# Altium footprint library 04.连接器件.pcb.PCBLIB: 363 footprints (part 1 of 23)
Each footprint in its own frame and in the unit in brackets; x right, y up, seen from the top. Pads: shape width x height; smd on the part's side, far side on the other; paste and mask are expansions set on the pad; w line width, h text height; cw(c..) or ccw(c..) is an arc to the next point about the centre after c.
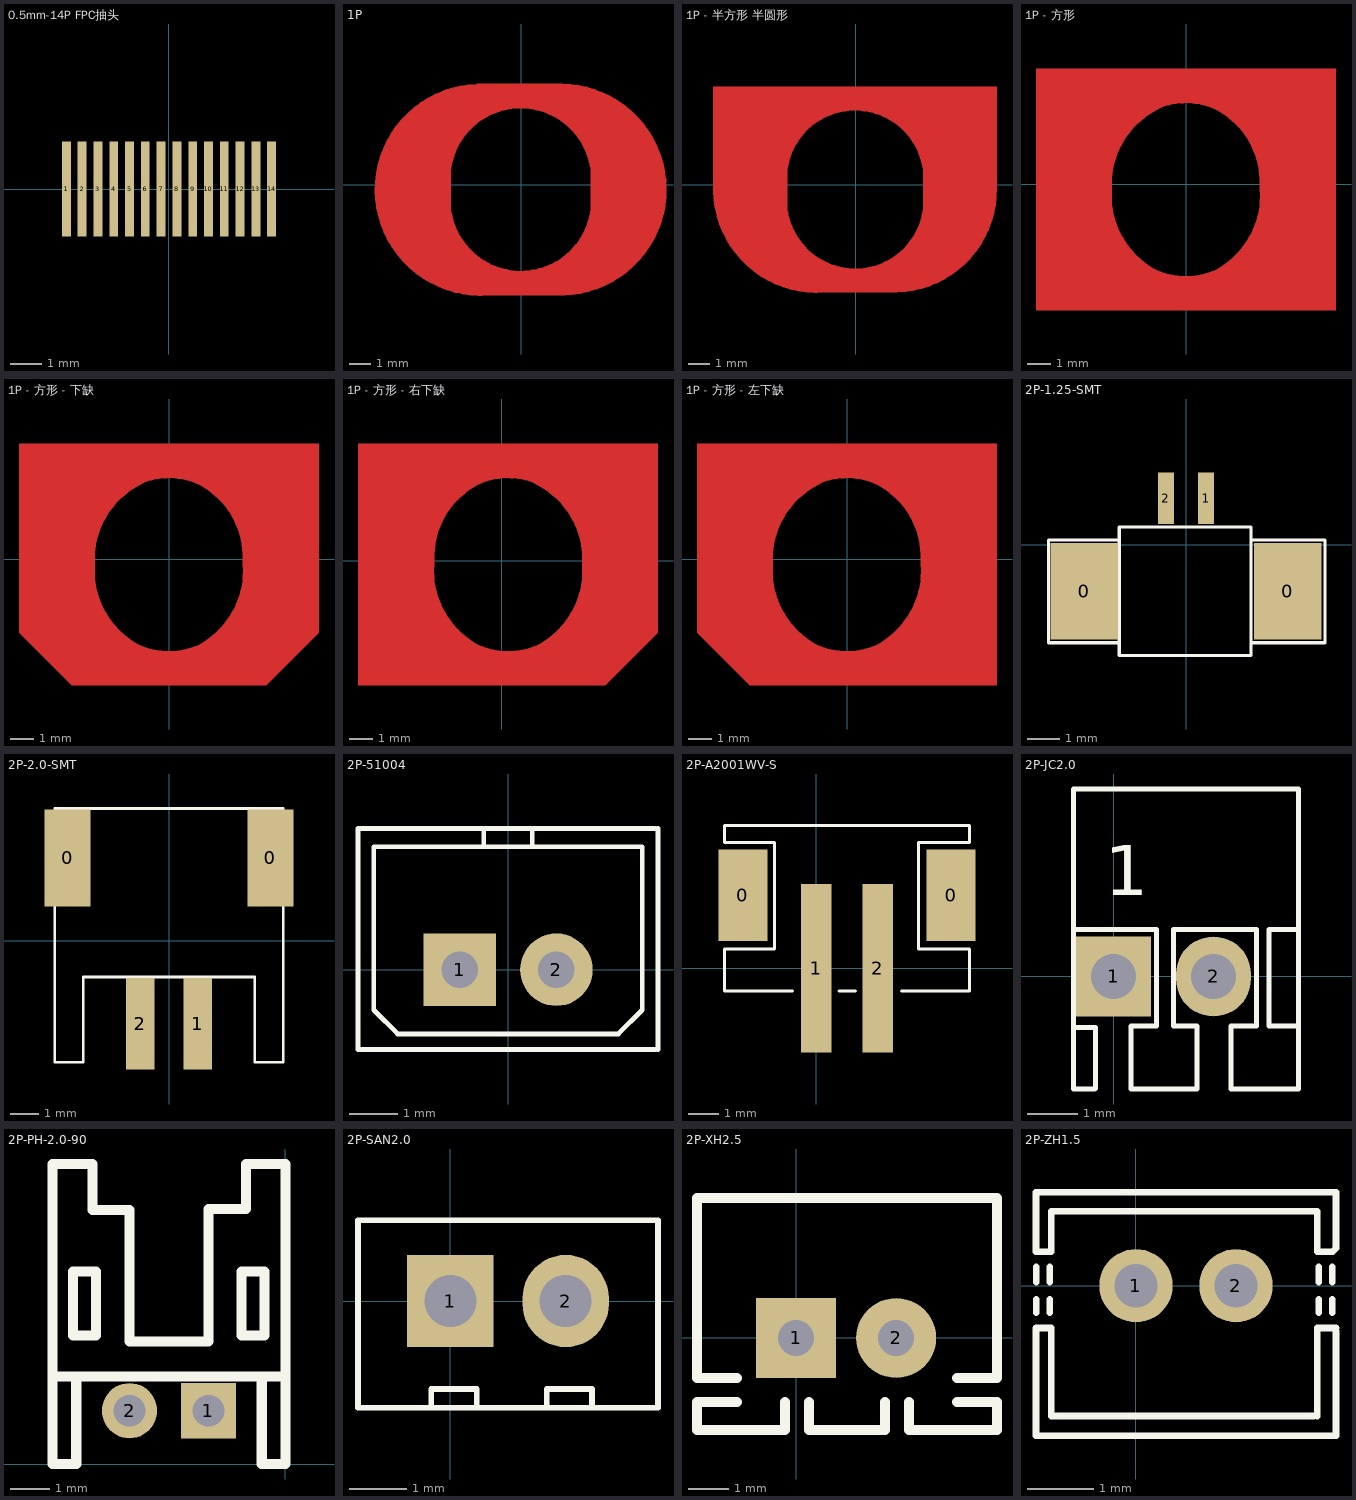
[diagram p0: the footprints below, top view; thin cyan lines are the x and y axes]

## 0.5mm-14P FPC抽头 [mm] "辅助锁触摸"
pads (14):
  rect 0.28x3 smd: 1(-3.25,0) 2(-2.75,0) 3(-2.25,0) 4(-1.75,0) 5(-1.25,0) 6(-0.75,0) 7(-0.25,0) 8(0.25,0) 9(0.75,0) 10(1.25,0) 11(1.75,0) 12(2.25,0) 13(2.75,0) 14(3.25,0)

## 1P [mm] "触摸按键"
TopLayer:
  circle w0.4: c-0.018,-0.234 r4.195
  rectangle: -2.176,-4.77 1.99,-4.604
  rectangle: -2.126,4.021 2.135,4.317
  region: 1.984,-4.734 1.984,-4.239 -2.061,-4.239 -2.061,-4.734
  region: -1.805,-4.377 -1.805,-3.837 -3.385,-3.837 -3.385,-4.377
  region: -4.353,-2.239 -4.353,1.917 -5.851,1.917 -5.851,-2.239
  region: -3.746,-2.878 -3.746,-2.157 -5.641,-2.157 -5.641,-2.878
  region: -2.993,-3.522 -2.993,-2.96 -4.851,-2.96 -4.851,-3.522
  region: -3.417,-3.253 -3.417,-2.687 -5.112,-2.687 -5.112,-3.253
  region: -3.581,-2.769 -3.581,-2.49 -3.901,-2.49 -3.901,-2.769
  region: -3.951,-2.244 -3.951,-1.814 -4.527,-1.814 -4.527,-2.244
  region: -4.084,-1.942 -4.084,-0.846 -4.513,-0.846 -4.513,-1.942
  region: -5.038,-3.039 -5.038,-2.783 -5.235,-2.783 -5.235,-3.039
  region: -2.568,-3.933 -2.568,-3.44 -4.084,-3.44 -4.084,-3.933
  region: -3.992,-3.81 -3.992,-3.417 -4.486,-3.417 -4.486,-3.81
  region: -3.271,-4.143 -3.271,-3.723 -3.869,-3.723 -3.869,-4.143
  region: -2.463,-3.906 -2.463,-3.728 -2.663,-3.728 -2.663,-3.906
  region: -4.034,0.565 -4.034,3.218 -4.509,3.218 -4.509,0.565
  region: -4.171,0.218 -4.171,0.903 -4.586,0.903 -4.586,0.218
  region: -4.435,1.848 -4.435,2.634 -5.244,2.634 -5.244,1.848
  region: -5.171,1.812 -5.171,2.346 -5.568,2.346 -5.568,1.812
  region: -4.362,2.542 -4.362,3.081 -5.006,3.081 -5.006,2.542
  region: -3.527,1.798 -3.527,3.721 -4.088,3.721 -4.088,1.798
  region: -3.846,1.437 -3.846,1.94 -4.166,1.94 -4.166,1.437
  region: -3.91,3.081 -3.91,3.428 -4.362,3.428 -4.362,3.081
  region: -5.76,-1.81 -5.76,1.328 -6.162,1.328 -6.162,-1.81
  region: 6.123,-0.906 6.123,1.241 4.205,1.241 4.205,-0.906
  region: 5.885,1.122 5.885,1.962 3.757,1.962 3.757,1.122
  region: 4.411,0.889 4.411,1.346 4.055,1.346 4.055,0.889
  region: 6.114,-1.855 6.114,-0.86 4.054,-0.86 4.054,-1.855
  region: 5.84,-2.49 5.84,-1.792 3.694,-1.792 3.694,-2.49
  region: 5.442,-2.856 5.442,-2.431 3.456,-2.431 3.456,-2.856
  region: 5.196,-3.221 5.196,-2.815 3.182,-2.815 3.182,-3.221
  region: 4.844,-3.627 4.844,-3.175 2.789,-3.175 2.789,-3.627
  region: 4.347,-3.824 4.347,-3.623 2.456,-3.623 2.456,-3.824
  region: 4.004,-3.956 4.004,-3.65 2.383,-3.65 2.383,-3.956
  region: 3.255,-4.135 3.255,-3.819 2.063,-3.819 2.063,-4.135
  region: 2.949,-3.65 2.949,-3.559 2.661,-3.559 2.661,-3.65
  region: 2.123,-4.239 2.123,-4.075 1.606,-4.075 1.606,-4.239
  region: 2.397,-4.472 2.397,-3.993 1.785,-3.993 1.785,-4.472
  region: 5.539,1.862 5.539,2.282 3.68,2.282 3.68,1.862
  region: 5.297,2.177 5.297,2.693 3.392,2.693 3.392,2.177
  region: 3.748,2.008 3.748,2.264 3.534,2.264 3.534,2.008
  region: 4.972,2.597 4.972,3.045 2.903,3.045 2.903,2.597
  region: 3.547,2.438 3.547,2.757 3.182,2.757 3.182,2.438
  region: 4.479,2.953 4.479,3.342 2.598,3.342 2.598,2.953
  region: 4.182,3.237 4.182,3.702 2.008,3.702 2.008,3.237
  region: 3.283,3.574 3.283,3.885 1.57,3.885 1.57,3.574
  region: 2.022,3.867 2.022,4.264 -2.042,4.264 -2.042,3.867
  region: -2.983,2.474 -2.983,3.924 -3.582,3.924 -3.582,2.474
  region: -3.431,2.33 -3.431,2.602 -3.632,2.602 -3.632,2.33
  region: -1.59,3.739 -1.59,4.091 -2.645,4.091 -2.645,3.739
  region: -1.873,3.62 -1.873,3.931 -3.097,3.931 -3.097,3.62
  region: -2.357,3.076 -2.357,3.812 -3.079,3.812 -3.079,3.076
  region: -2.042,3.392 -2.042,3.867 -2.458,3.867 -2.458,3.392
  region: -2.86,2.917 -2.86,3.195 -3.134,3.195 -3.134,2.917
  region: -2.54,3.757 -2.54,4.081 -3.186,4.081 -3.186,3.757
  lines w0.4: 1.851,-4.532 ccw(c1.93,-3.996) 2.465,-4.075 ; 1.865,-4.486 ccw(c2.102,-3.687) 2.901,-3.924 ; 2.159,-4.438 ccw(c2.491,-3.288) 3.641,-3.621
  lines w0.5: -3.124,2.795 ccw(c0.928,0.061) -1.024,-4.42 ; -2.598,2.95 cw(c0.025,0.527) -1.554,3.73 ; -2.072,-4.52 cw(c-2.033,-0.23) -1.992,4.06 ; -1.271,3.929 ccw(c0.722,-0.156) -1.073,-4.333 ; 0.549,3.954 cw(c-0.023,0.556) 2.921,2.346 ; 1.357,4.002 cw(c-1.014,-0.135) 1.616,-4.112 ; 1.504,-4.481 ccw(c2.017,-0.222) 2.056,4.068 ; 2.921,2.363 cw(c-0.852,-0.254) 3.701,-0.848
  lines w0.8: -3.647,0.584 cw(c-0.022,0.275) 3.555,0.943 ; -3.628,1.459 -3.628,-1.477 -3.598,-1.507 ; -3.594,-1.407 ccw(c-0.017,-0.739) 3.591,-1.212 ; -2.117,-4.668 -2.062,-4.723 1.933,-4.723 ccw(c1.819,-0.233) 1.838,4.259 -1.93,4.259 -2.102,4.087 ; -1.981,4.249 ccw(c-1.867,-0.241) -1.887,-4.733 ; 3.436,1.807 3.59,1.653 3.59,-1.226

## 1P - 半方形 半圆形 [mm] "触摸按键"
TopLayer:
  circle w0.4: c-0.018,-0.234 r4.195
  region: -2.54,3.757 -2.54,4.081 -3.186,4.081 -3.186,3.757
  region: -2.86,2.917 -2.86,3.195 -3.134,3.195 -3.134,2.917
  region: -2.042,3.392 -2.042,3.867 -2.458,3.867 -2.458,3.392
  region: -2.357,3.076 -2.357,3.812 -3.079,3.812 -3.079,3.076
  region: -1.873,3.62 -1.873,3.931 -3.097,3.931 -3.097,3.62
  region: -1.59,3.739 -1.59,4.091 -2.645,4.091 -2.645,3.739
  region: -3.431,2.33 -3.431,2.602 -3.632,2.602 -3.632,2.33
  region: -2.983,2.474 -2.983,3.924 -3.582,3.924 -3.582,2.474
  region: 2.022,3.867 2.022,4.264 -2.042,4.264 -2.042,3.867
  region: 3.283,3.574 3.283,3.885 1.57,3.885 1.57,3.574
  region: 4.182,3.237 4.182,3.702 2.008,3.702 2.008,3.237
  region: 4.479,2.953 4.479,3.342 2.598,3.342 2.598,2.953
  region: 3.547,2.438 3.547,2.757 3.182,2.757 3.182,2.438
  region: 4.972,2.597 4.972,3.045 2.903,3.045 2.903,2.597
  region: 3.748,2.008 3.748,2.264 3.534,2.264 3.534,2.008
  region: 5.297,2.177 5.297,2.693 3.392,2.693 3.392,2.177
  region: 5.539,1.862 5.539,2.282 3.68,2.282 3.68,1.862
  region: 2.397,-4.472 2.397,-3.993 1.785,-3.993 1.785,-4.472
  region: 2.123,-4.239 2.123,-4.075 1.606,-4.075 1.606,-4.239
  region: 2.949,-3.65 2.949,-3.559 2.661,-3.559 2.661,-3.65
  region: 3.255,-4.135 3.255,-3.819 2.063,-3.819 2.063,-4.135
  region: 4.004,-3.956 4.004,-3.65 2.383,-3.65 2.383,-3.956
  region: 4.347,-3.824 4.347,-3.623 2.456,-3.623 2.456,-3.824
  region: 4.844,-3.627 4.844,-3.175 2.789,-3.175 2.789,-3.627
  region: 5.196,-3.221 5.196,-2.815 3.182,-2.815 3.182,-3.221
  region: 5.442,-2.856 5.442,-2.431 3.456,-2.431 3.456,-2.856
  region: 5.84,-2.49 5.84,-1.792 3.694,-1.792 3.694,-2.49
  region: 6.114,-1.855 6.114,-0.86 4.054,-0.86 4.054,-1.855
  region: 4.411,0.889 4.411,1.346 4.055,1.346 4.055,0.889
  region: 5.885,1.122 5.885,1.962 3.757,1.962 3.757,1.122
  region: 6.123,-0.906 6.123,1.241 4.205,1.241 4.205,-0.906
  region: -5.76,-1.81 -5.76,1.328 -6.162,1.328 -6.162,-1.81
  region: -3.91,3.081 -3.91,3.428 -4.362,3.428 -4.362,3.081
  region: -3.846,1.437 -3.846,1.94 -4.166,1.94 -4.166,1.437
  region: -3.527,1.798 -3.527,3.721 -4.088,3.721 -4.088,1.798
  region: -4.362,2.542 -4.362,3.081 -5.006,3.081 -5.006,2.542
  region: -5.171,1.812 -5.171,2.346 -5.568,2.346 -5.568,1.812
  region: -4.435,1.848 -4.435,2.634 -5.244,2.634 -5.244,1.848
  region: -4.171,0.218 -4.171,0.903 -4.586,0.903 -4.586,0.218
  region: -4.034,0.565 -4.034,3.218 -4.509,3.218 -4.509,0.565
  region: -2.463,-3.906 -2.463,-3.728 -2.663,-3.728 -2.663,-3.906
  region: -3.271,-4.143 -3.271,-3.723 -3.869,-3.723 -3.869,-4.143
  region: -3.992,-3.81 -3.992,-3.417 -4.486,-3.417 -4.486,-3.81
  region: -2.568,-3.933 -2.568,-3.44 -4.084,-3.44 -4.084,-3.933
  region: -5.038,-3.039 -5.038,-2.783 -5.235,-2.783 -5.235,-3.039
  region: -4.084,-1.942 -4.084,-0.846 -4.513,-0.846 -4.513,-1.942
  region: -3.951,-2.244 -3.951,-1.814 -4.527,-1.814 -4.527,-2.244
  region: -3.581,-2.769 -3.581,-2.49 -3.901,-2.49 -3.901,-2.769
  region: -3.417,-3.253 -3.417,-2.687 -5.112,-2.687 -5.112,-3.253
  region: -2.993,-3.522 -2.993,-2.96 -4.851,-2.96 -4.851,-3.522
  region: -3.746,-2.878 -3.746,-2.157 -5.641,-2.157 -5.641,-2.878
  region: -4.353,-2.239 -4.353,1.917 -5.851,1.917 -5.851,-2.239
  region: -1.805,-4.377 -1.805,-3.837 -3.385,-3.837 -3.385,-4.377
  region: 1.984,-4.734 1.984,-4.239 -2.061,-4.239 -2.061,-4.734
  rectangle: -2.126,4.021 2.135,4.317
  rectangle: -2.176,-4.77 1.99,-4.604
  rectangle: -6.76,-0.109 -3.233,4.384
  rectangle: -3.233,4.384 3.286,4.66
  rectangle: 3.286,-0.125 6.713,4.384
  rectangle: 3.286,4.384 6.713,4.66
  rectangle: -6.76,4.384 -3.233,4.66
  lines w0.4: 1.851,-4.532 ccw(c1.93,-3.996) 2.465,-4.075 ; 1.865,-4.486 ccw(c2.102,-3.687) 2.901,-3.924 ; 2.159,-4.438 ccw(c2.491,-3.288) 3.641,-3.621
  lines w0.5: -3.124,2.795 ccw(c0.928,0.061) -1.024,-4.42 ; -2.598,2.95 cw(c0.025,0.527) -1.554,3.73 ; -2.072,-4.52 cw(c-2.033,-0.23) -1.992,4.06 ; -1.271,3.929 ccw(c0.722,-0.156) -1.073,-4.333 ; 0.549,3.954 cw(c-0.023,0.556) 2.921,2.346 ; 1.357,4.002 cw(c-1.014,-0.135) 1.616,-4.112 ; 1.504,-4.481 ccw(c2.017,-0.222) 2.056,4.068 ; 2.921,2.363 cw(c-0.852,-0.254) 3.701,-0.848
  lines w0.8: -3.647,0.584 cw(c-0.022,0.275) 3.555,0.943 ; -3.628,1.459 -3.628,-1.477 -3.598,-1.507 ; -3.594,-1.407 ccw(c-0.017,-0.739) 3.591,-1.212 ; -2.117,-4.668 -2.062,-4.723 1.933,-4.723 ccw(c1.819,-0.233) 1.838,4.259 -1.93,4.259 -2.102,4.087 ; -1.981,4.249 ccw(c-1.867,-0.241) -1.887,-4.733 ; 3.436,1.807 3.59,1.653 3.59,-1.226

## 1P - 方形 [mm] "触摸按键"
TopLayer:
  circle w0.4: c-0.018,-0.234 r4.195
  rectangle: -2.176,-4.77 1.99,-4.604
  rectangle: -2.126,4.021 2.135,4.317
  region: 1.984,-4.734 1.984,-4.239 -2.061,-4.239 -2.061,-4.734
  region: -1.805,-4.377 -1.805,-3.837 -3.385,-3.837 -3.385,-4.377
  region: -2.993,-3.522 -2.993,-2.96 -4.851,-2.96 -4.851,-3.522
  region: -3.417,-3.253 -3.417,-2.687 -5.112,-2.687 -5.112,-3.253
  region: -3.581,-2.769 -3.581,-2.49 -3.901,-2.49 -3.901,-2.769
  region: -3.951,-2.244 -3.951,-1.814 -4.527,-1.814 -4.527,-2.244
  region: -4.084,-1.942 -4.084,-0.846 -4.513,-0.846 -4.513,-1.942
  region: -5.038,-3.039 -5.038,-2.783 -5.235,-2.783 -5.235,-3.039
  region: -2.568,-3.933 -2.568,-3.44 -4.084,-3.44 -4.084,-3.933
  region: -3.992,-3.81 -3.992,-3.417 -4.486,-3.417 -4.486,-3.81
  region: -3.271,-4.143 -3.271,-3.723 -3.869,-3.723 -3.869,-4.143
  region: -2.463,-3.906 -2.463,-3.728 -2.663,-3.728 -2.663,-3.906
  region: -4.034,0.565 -4.034,3.218 -4.509,3.218 -4.509,0.565
  region: -4.171,0.218 -4.171,0.903 -4.586,0.903 -4.586,0.218
  region: -4.435,1.848 -4.435,2.634 -5.244,2.634 -5.244,1.848
  region: -4.362,2.542 -4.362,3.081 -5.006,3.081 -5.006,2.542
  region: -3.527,1.798 -3.527,3.721 -4.088,3.721 -4.088,1.798
  region: -3.846,1.437 -3.846,1.94 -4.166,1.94 -4.166,1.437
  region: -3.91,3.081 -3.91,3.428 -4.362,3.428 -4.362,3.081
  region: 4.411,0.889 4.411,1.346 4.055,1.346 4.055,0.889
  region: 5.442,-2.856 5.442,-2.431 3.456,-2.431 3.456,-2.856
  region: 5.196,-3.221 5.196,-2.815 3.182,-2.815 3.182,-3.221
  region: 4.844,-3.627 4.844,-3.175 2.789,-3.175 2.789,-3.627
  region: 4.347,-3.824 4.347,-3.623 2.456,-3.623 2.456,-3.824
  region: 4.004,-3.956 4.004,-3.65 2.383,-3.65 2.383,-3.956
  region: 3.255,-4.135 3.255,-3.819 2.063,-3.819 2.063,-4.135
  region: 2.949,-3.65 2.949,-3.559 2.661,-3.559 2.661,-3.65
  region: 2.123,-4.239 2.123,-4.075 1.606,-4.075 1.606,-4.239
  region: 2.397,-4.472 2.397,-3.993 1.785,-3.993 1.785,-4.472
  region: 5.486,1.862 5.486,2.619 3.68,2.619 3.68,1.862
  region: 5.297,2.177 5.297,2.693 3.392,2.693 3.392,2.177
  region: 3.748,2.008 3.748,2.264 3.534,2.264 3.534,2.008
  region: 4.972,2.597 4.972,3.045 2.903,3.045 2.903,2.597
  region: 3.547,2.438 3.547,2.757 3.182,2.757 3.182,2.438
  region: 4.479,2.953 4.479,3.342 2.598,3.342 2.598,2.953
  region: 4.182,3.237 4.182,3.702 2.008,3.702 2.008,3.237
  region: 3.283,3.574 3.283,3.885 1.57,3.885 1.57,3.574
  region: 2.022,3.867 2.022,4.264 -2.042,4.264 -2.042,3.867
  region: -2.983,2.474 -2.983,3.924 -3.582,3.924 -3.582,2.474
  region: -3.431,2.33 -3.431,2.602 -3.632,2.602 -3.632,2.33
  region: -1.59,3.739 -1.59,4.091 -2.645,4.091 -2.645,3.739
  region: -1.873,3.62 -1.873,3.931 -3.097,3.931 -3.097,3.62
  region: -2.357,3.076 -2.357,3.812 -3.079,3.812 -3.079,3.076
  region: -2.042,3.392 -2.042,3.867 -2.458,3.867 -2.458,3.392
  region: -2.86,2.917 -2.86,3.195 -3.134,3.195 -3.134,2.917
  region: -2.54,3.757 -2.54,4.081 -3.186,4.081 -3.186,3.757
  rectangle: -5.514,-5.471 -3.745,5.027
  rectangle: 3.74,-3.116 5.486,1.862
  rectangle: -3.745,3.563 -1.228,5.026
  rectangle: -1.46,3.864 5.486,5.026
  rectangle: 3.166,2.619 5.486,3.864
  rectangle: -3.745,-5.472 -1.559,-3.955
  rectangle: -1.559,-5.472 4.491,-4.209
  rectangle: 4.491,-5.472 5.486,-3.116
  rectangle: 3.293,-4.529 4.816,-3.237
  rectangle: 5.486,-5.472 6.486,5.027
  rectangle: -6.514,-5.471 -5.514,5.027
  lines w0.4: 1.851,-4.532 ccw(c1.93,-3.996) 2.465,-4.075 ; 1.865,-4.486 ccw(c2.102,-3.687) 2.901,-3.924 ; 2.159,-4.438 ccw(c2.491,-3.288) 3.641,-3.621
  lines w0.5: -3.483,-0.201 cw(c0.424,-0.023) 0.246,3.883 ; -3.48,-0.798 ccw(c0.466,-0.45) 0.814,-4.396 ; -3.124,2.795 ccw(c0.928,0.061) -1.024,-4.42 ; -2.598,2.95 cw(c0.025,0.527) -1.554,3.73 ; -1.271,3.929 ccw(c0.722,-0.156) -1.073,-4.333 ; -0.124,3.872 cw(c-0.367,0.086) 3.42,-0.157 ; 0.549,3.954 cw(c-0.023,0.556) 2.921,2.346 ; 0.766,-4.196 ccw(c-0.479,-0.476) 3.431,-0.154 ; 1.357,4.002 cw(c-1.014,-0.135) 1.616,-4.112 ; 2.921,2.363 cw(c-0.852,-0.254) 3.701,-0.848
  lines w0.8: -3.647,0.584 cw(c-0.022,0.275) 3.555,0.943 ; -3.628,1.459 -3.628,-1.477 -3.598,-1.507 ; -3.594,-1.407 ccw(c-0.017,-0.739) 3.591,-1.212 ; -2.117,-4.668 -2.062,-4.723 1.933,-4.723 ; -2.102,4.087 -1.93,4.259 1.838,4.259 ; 3.436,1.807 3.59,1.653 3.59,-1.226

## 1P - 方形 - 下缺 [mm] "触摸按键"
TopLayer:
  circle w0.4: c-0.018,-0.234 r4.195
  rectangle: -4.24,-4.146 -4.069,-3.979
  rectangle: -4.574,-3.776 -4.42,-3.668
  rectangle: -4.669,-3.686 -4.427,-3.578
  rectangle: -4.737,-3.597 -4.435,-3.49
  rectangle: -4.454,-3.937 -4.271,-3.767
  rectangle: -4.32,-4.007 -4.05,-3.716
  rectangle: -3.43,-4.939 -3.247,-4.83
  rectangle: -3.561,-4.805 -3.424,-4.644
  rectangle: -3.47,-4.854 -3.281,-4.66
  rectangle: -3.828,-4.519 -3.681,-4.412
  rectangle: -3.944,-4.435 -3.686,-4.284
  rectangle: -4.025,-4.284 -3.944,-4.209
  rectangle: -3.991,-4.349 -3.602,-4.064
  rectangle: -4.114,-4.238 -3.815,-3.873
  rectangle: -3.704,-4.605 -3.636,-4.518
  rectangle: -3.657,-4.7 -3.191,-4.127
  rectangle: -3.741,-4.564 -3.472,-4.209
  rectangle: -2.944,-5.42 -2.491,-5.277
  rectangle: -3.24,-5.037 -3.226,-4.996
  rectangle: -3.211,-5.21 -2.964,-4.984
  rectangle: -3.052,-5.333 -2.335,-4.945
  rectangle: -3.309,-5.031 -2.478,-4.354
  rectangle: -4.993,-3.401 -4.782,-3.225
  rectangle: -5.229,-3.138 -5.066,-3.018
  rectangle: -5.349,-3.018 -5.166,-2.907
  rectangle: -5.417,-2.92 -5.158,-2.813
  rectangle: -5.477,-2.842 -5.092,-2.649
  rectangle: -6.065,-2.308 -5.908,-2.148
  rectangle: -5.947,-2.449 -5.716,-2.134
  rectangle: -5.597,-2.738 -5.477,-2.649
  rectangle: -5.688,-2.674 -5.423,-2.552
  rectangle: -5.798,-2.581 -5.418,-2.115
  rectangle: -6.267,-2.124 -6.092,-1.967
  rectangle: -6.443,-1.923 -6.257,-1.568
  rectangle: -6.342,-2.019 -6.144,-1.634
  rectangle: -6.144,-2.183 -5.383,-1.634
  rectangle: -2.176,-4.77 1.99,-4.604
  rectangle: -2.126,4.021 2.135,4.317
  region: 1.984,-4.734 1.984,-4.239 -2.061,-4.239 -2.061,-4.734
  region: -1.805,-4.377 -1.805,-3.837 -3.385,-3.837 -3.385,-4.377
  region: -2.993,-3.522 -2.993,-2.96 -4.851,-2.96 -4.851,-3.522
  region: -3.417,-3.253 -3.417,-2.687 -5.112,-2.687 -5.112,-3.253
  region: -3.581,-2.769 -3.581,-2.49 -3.901,-2.49 -3.901,-2.769
  region: -3.951,-2.244 -3.951,-1.814 -4.527,-1.814 -4.527,-2.244
  region: -4.084,-1.942 -4.084,-0.846 -4.513,-0.846 -4.513,-1.942
  region: -5.038,-3.039 -5.038,-2.783 -5.235,-2.783 -5.235,-3.039
  region: -2.568,-3.933 -2.568,-3.44 -4.084,-3.44 -4.084,-3.933
  region: -3.992,-3.81 -3.992,-3.417 -4.486,-3.417 -4.486,-3.81
  region: -3.271,-4.143 -3.271,-3.723 -3.869,-3.723 -3.869,-4.143
  region: -2.463,-3.906 -2.463,-3.728 -2.663,-3.728 -2.663,-3.906
  region: -4.034,0.565 -4.034,3.218 -4.509,3.218 -4.509,0.565
  region: -4.171,0.218 -4.171,0.903 -4.586,0.903 -4.586,0.218
  region: -4.435,1.848 -4.435,2.634 -5.244,2.634 -5.244,1.848
  region: -4.362,2.542 -4.362,3.081 -5.006,3.081 -5.006,2.542
  region: -3.527,1.798 -3.527,3.721 -4.088,3.721 -4.088,1.798
  region: -3.846,1.437 -3.846,1.94 -4.166,1.94 -4.166,1.437
  region: -3.91,3.081 -3.91,3.428 -4.362,3.428 -4.362,3.081
  region: 4.411,0.889 4.411,1.346 4.055,1.346 4.055,0.889
  region: 5.442,-2.856 5.442,-2.431 3.456,-2.431 3.456,-2.856
  region: 5.196,-3.221 5.196,-2.815 3.182,-2.815 3.182,-3.221
  region: 4.844,-3.627 4.844,-3.175 2.789,-3.175 2.789,-3.627
  region: 4.347,-3.824 4.347,-3.623 2.456,-3.623 2.456,-3.824
  region: 4.004,-3.956 4.004,-3.65 2.383,-3.65 2.383,-3.956
  region: 3.255,-4.135 3.255,-3.819 2.063,-3.819 2.063,-4.135
  region: 2.949,-3.65 2.949,-3.559 2.661,-3.559 2.661,-3.65
  region: 2.123,-4.239 2.123,-4.075 1.606,-4.075 1.606,-4.239
  region: 2.397,-4.472 2.397,-3.993 1.785,-3.993 1.785,-4.472
  region: 5.486,1.862 5.486,2.619 3.68,2.619 3.68,1.862
  region: 5.297,2.177 5.297,2.693 3.392,2.693 3.392,2.177
  region: 3.748,2.008 3.748,2.264 3.534,2.264 3.534,2.008
  region: 4.972,2.597 4.972,3.045 2.903,3.045 2.903,2.597
  region: 3.547,2.438 3.547,2.757 3.182,2.757 3.182,2.438
  region: 4.479,2.953 4.479,3.342 2.598,3.342 2.598,2.953
  region: 4.182,3.237 4.182,3.702 2.008,3.702 2.008,3.237
  region: 3.283,3.574 3.283,3.885 1.57,3.885 1.57,3.574
  region: 2.022,3.867 2.022,4.264 -2.042,4.264 -2.042,3.867
  region: -2.983,2.474 -2.983,3.924 -3.582,3.924 -3.582,2.474
  region: -3.431,2.33 -3.431,2.602 -3.632,2.602 -3.632,2.33
  region: -1.59,3.739 -1.59,4.091 -2.645,4.091 -2.645,3.739
  region: -1.873,3.62 -1.873,3.931 -3.097,3.931 -3.097,3.62
  region: -2.357,3.076 -2.357,3.812 -3.079,3.812 -3.079,3.076
  region: -2.042,3.392 -2.042,3.867 -2.458,3.867 -2.458,3.392
  region: -2.86,2.917 -2.86,3.195 -3.134,3.195 -3.134,2.917
  region: -2.54,3.757 -2.54,4.081 -3.186,4.081 -3.186,3.757
  rectangle: -5.514,-2.771 -3.745,5.027
  rectangle: 3.74,-3.116 5.486,1.862
  rectangle: -3.745,3.563 -1.228,5.026
  rectangle: -1.46,3.864 5.486,5.026
  rectangle: 3.166,2.619 5.486,3.864
  rectangle: -2.537,-5.472 -1.559,-3.955
  rectangle: -1.559,-5.472 4.182,-4.209
  rectangle: 3.293,-4.529 4.816,-3.237
  rectangle: 5.486,-3.178 6.486,5.027
  rectangle: -6.514,-1.696 -5.514,5.027
  rectangle: -6.419,-2.566 -5.866,-1.996
  rectangle: -6.283,-2.651 -5.731,-2.538
  rectangle: -6.207,-2.772 -5.651,-2.624
  rectangle: -6.086,-2.893 -5.571,-2.751
  rectangle: -5.985,-3.013 -5.426,-2.865
  rectangle: -5.619,-2.884 -5.53,-2.816
  rectangle: -4.712,-4.288 -4.096,-3.67
  rectangle: -5.155,-3.865 -4.664,-3.179
  rectangle: -5.543,-3.396 -5.036,-2.936
  rectangle: -5.462,-3.457 -5.098,-3.377
  rectangle: -5.395,-3.53 -5.124,-3.447
  rectangle: -5.329,-3.589 -5.12,-3.522
  rectangle: -5.267,-3.66 -5.104,-3.578
  rectangle: -5.234,-3.66 -5.104,-3.641
  rectangle: -5.204,-3.713 -5.107,-3.65
  rectangle: -5.828,-3.085 -5.506,-2.968
  rectangle: -5.776,-3.129 -5.507,-3.063
  rectangle: -5.729,-3.185 -5.509,-3.117
  rectangle: -5.67,-3.248 -5.502,-3.178
  rectangle: -5.635,-3.31 -5.499,-3.23
  rectangle: -5.87,-3.032 -5.828,-2.968
  rectangle: -5.022,-3.966 -4.658,-3.831
  rectangle: -4.908,-4.037 -4.651,-3.944
  rectangle: -4.843,-4.145 -4.62,-4.015
  rectangle: -4.561,-4.435 -3.944,-4.265
  rectangle: -4.428,-4.553 -3.836,-4.414
  rectangle: -4.309,-4.642 -3.775,-4.534
  rectangle: -4.228,-4.763 -3.643,-4.626
  rectangle: -4.087,-4.876 -3.528,-4.743
  rectangle: -3.988,-4.971 -3.423,-4.858
  rectangle: -3.898,-5.055 -3.349,-4.951
  rectangle: -3.803,-5.178 -3.229,-5.041
  rectangle: -3.691,-5.274 -3.119,-5.161
  rectangle: -3.587,-5.376 -3.043,-5.253
  rectangle: 4.794,-3.908 5.688,-3.178
  rectangle: 4.735,-4.317 5.33,-3.805
  rectangle: 4.042,-4.971 4.646,-4.364
  rectangle: 4.501,-4.882 4.741,-4.187
  rectangle: 4.661,-4.782 4.847,-4.213
  rectangle: 4.813,-4.67 4.952,-4.275
  rectangle: 4.929,-4.57 5.03,-4.301